# Altium footprint library Espressif.PcbLib: 4 footprints
Each footprint in its own frame and in the unit in brackets; x right, y up, seen from the top. Pads: shape width x height; smd on the part's side, far side on the other; paste and mask are expansions set on the pad; w line width, h text height; cw(c..) or ccw(c..) is an arc to the next point about the centre after c.
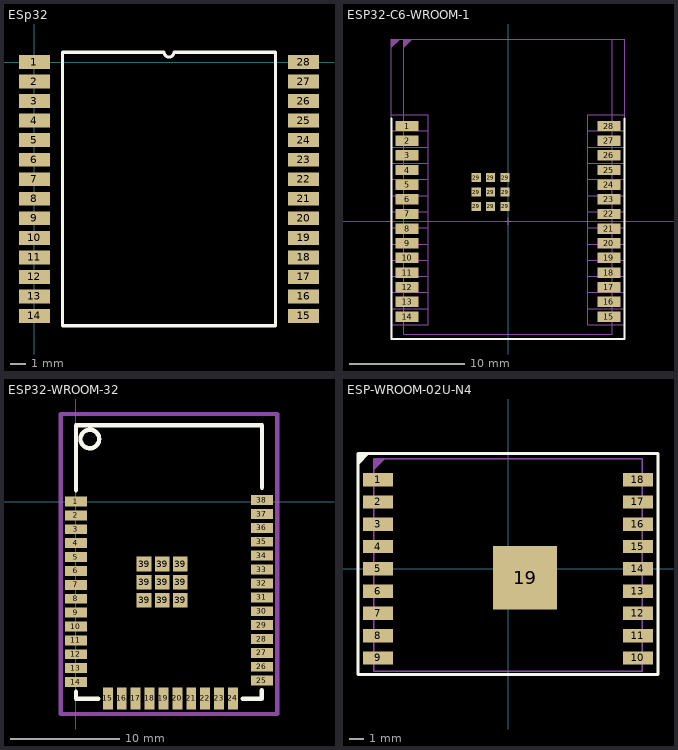
[diagram p0: the footprints below, top view; thin cyan lines are the x and y axes]

## ESp32 [mm]
pads (28):
  rect 2x0.9 smd: 1(0,0) 2(0,-1.27) 3(0,-2.54) 4(0,-3.81) 5(0,-5.08) 6(0,-6.35) 7(0,-7.62) 8(0,-8.89) 9(0,-10.16) 10(0,-11.43) 11(0,-12.7) 12(0,-13.97) 13(0,-15.24) 14(0,-16.51) 15(17.5,-16.51) 16(17.5,-15.24) 17(17.5,-13.97) 18(17.5,-12.7) 19(17.5,-11.43) 20(17.5,-10.16) 21(17.5,-8.89) 22(17.5,-7.62) 23(17.5,-6.35) 24(17.5,-5.08) 25(17.5,-3.81) 26(17.5,-2.54) 27(17.5,-1.27) 28(17.5,0)
Top Overlay:
  lines w0.2: 1.835,-17.145 1.835,0.635 8.433,0.635 ccw(c8.75,0.635) 9.068,0.635 15.665,0.635 15.665,-17.145 1.835,-17.145

## ESP32-C6-WROOM-1 [mm]
pads (37):
  rect 2x0.9 smd: 1(-8.75,8.255) 2(-8.75,6.985) 3(-8.75,5.715) 4(-8.75,4.445) 5(-8.75,3.175) 6(-8.75,1.905) 7(-8.75,0.635) 8(-8.75,-0.635) 9(-8.75,-1.905) 10(-8.75,-3.175) 11(-8.75,-4.445) 12(-8.75,-5.715) 13(-8.75,-6.985) 14(-8.75,-8.255) 15(8.75,-8.255) 16(8.75,-6.985) 17(8.75,-5.715) 18(8.75,-4.445) 19(8.75,-3.175) 20(8.75,-1.905) 21(8.75,-0.635) 22(8.75,0.635) 23(8.75,1.905) 24(8.75,3.175) 25(8.75,4.445) 26(8.75,5.715) 27(8.75,6.985) 28(8.75,8.255)
  rect 0.8x0.8 smd: 29(-2.755,1.285) 29(-2.755,2.535) 29(-2.755,3.785) 29(-1.505,1.285) 29(-1.505,2.535) 29(-1.505,3.785) 29(-0.255,1.285) 29(-0.255,2.535) 29(-0.255,3.785)
Top Overlay:
  lines w0.2: -10.1,8.9 -10.1,-10.2 10.1,-10.2 10.1,8.9
Top Assembly:
  region: -9.025,15.8 -9.025,15.1 -8.325,15.8
  lines w0.1: -9.025,15.1 -8.325,15.8 ; -9.025,-9.8 -9.025,15.8 9.05,15.8 9.05,-9.8 -9.025,-9.8
  text "'.Designator'" at -4.532,-0.333 h0.8
Top Courtyard:
  region: -10.1,15.8 -10.1,15.1 -9.4,15.8
  lines w0.1: -10.1,15.1 -9.4,15.8 ; -0.3,0 0.3,0 ; 0,-0.3 0,0.3 ; -10.1,-10.2 -10.1,15.8 10.1,15.8 10.1,-10.2 -10.1,-10.2
  text "'.Designator'" at -4.532,-0.333 h0.8
Bottom Courtyard:
  lines w0.1: -10.1,-7.57 -10.1,-8.97 -6.9,-8.97 -6.9,-7.57 ; -10.1,-7.57 -10.1,-6.17 ; -10.1,-7.57 -6.9,-7.57 ; -10.1,-6.17 -10.1,-4.77 ; -10.1,-6.17 -6.9,-6.17 ; -10.1,-4.77 -10.1,-3.37 ; -10.1,-4.77 -6.9,-4.77 ; -10.1,-3.37 -6.9,-3.37 ; -10.1,-3.37 -10.1,-1.97 ; -10.1,-1.97 -10.1,-0.57 ; -10.1,-1.97 -6.9,-1.97 ; -10.1,-0.57 -10.1,0.83 ; -10.1,-0.57 -6.9,-0.57 ; -10.1,0.83 -10.1,2.23 ; -10.1,0.83 -6.9,0.83 ; -10.1,2.23 -10.1,3.63 ; -10.1,2.23 -6.9,2.23 ; -10.1,3.63 -10.1,5.03 ; -10.1,3.63 -6.9,3.63 ; -10.1,5.03 -10.1,6.43 ; -10.1,5.03 -6.9,5.03 ; -10.1,6.43 -10.1,7.83 ; -10.1,6.43 -6.9,6.43 ; -10.1,7.83 -10.1,9.23 -6.9,9.23 -6.9,7.83 ; -10.1,7.83 -6.9,7.83 ; -6.9,-7.57 -6.9,-6.17 ; -6.9,-6.17 -6.9,-4.77 ; -6.9,-4.77 -6.9,-3.37 ; -6.9,-3.37 -6.9,-1.97 ; -6.9,-1.97 -6.9,-0.57 ; -6.9,-0.57 -6.9,0.83 ; -6.9,0.83 -6.9,2.23 ; -6.9,2.23 -6.9,3.63 ; -6.9,3.63 -6.9,5.03 ; -6.9,5.03 -6.9,6.43 ; -6.9,6.43 -6.9,7.83 ; 6.9,-7.57 10.1,-7.57 ; 6.9,-7.57 6.9,-6.17 ; 6.9,-7.57 6.9,-8.97 10.1,-8.97 10.1,-7.57 ; 6.9,-6.17 6.9,-4.77 ; 6.9,-6.17 10.1,-6.17 ; 6.9,-4.77 6.9,-3.37 ; 6.9,-4.77 10.1,-4.77 ; 6.9,-3.37 6.9,-1.97 ; 6.9,-3.37 10.1,-3.37 ; 6.9,-1.97 6.9,-0.57 ; 6.9,-1.97 10.1,-1.97 ; 6.9,-0.57 6.9,0.83 ; 6.9,-0.57 10.1,-0.57 ; 6.9,0.83 6.9,2.23 ; 6.9,0.83 10.1,0.83 ; 6.9,2.23 6.9,3.63 ; 6.9,2.23 10.1,2.23 ; 6.9,3.63 6.9,5.03 ; 6.9,3.63 10.1,3.63 ; 6.9,5.03 6.9,6.43 ; 6.9,5.03 10.1,5.03 ; 6.9,6.43 6.9,7.83 ; 6.9,6.43 10.1,6.43 ; 6.9,7.83 6.9,9.23 10.1,9.23 10.1,7.83 ; 6.9,7.83 10.1,7.83 ; 10.1,-7.57 10.1,-6.17 ; 10.1,-6.17 10.1,-4.77 ; 10.1,-4.77 10.1,-3.37 ; 10.1,-3.37 10.1,-1.97 ; 10.1,-1.97 10.1,-0.57 ; 10.1,-0.57 10.1,0.83 ; 10.1,0.83 10.1,2.23 ; 10.1,2.23 10.1,3.63 ; 10.1,3.63 10.1,5.03 ; 10.1,5.03 10.1,6.43 ; 10.1,6.43 10.1,7.83
3D body "ESP32-C6-WROOM-1.STEP": height 3.16, standoff 0, extent -8.922,-9.766 9.078,15.734

## ESP32-WROOM-32 [mm]
pads (47):
  rect 2x0.9 smd: 1(0,0) 2(0,-1.27) 3(0,-2.54) 4(0,-3.81) 5(0,-5.08) 6(0,-6.35) 7(0,-7.62) 8(0,-8.89) 9(0,-10.16) 10(0,-11.43) 11(0,-12.7) 12(0,-13.97) 13(0,-15.24) 14(0,-16.51) 25(17,-16.383) 26(17,-15.113) 27(17,-13.843) 28(17,-12.573) 29(17,-11.303) 30(17,-10.033) 31(17,-8.763) 32(17,-7.493) 33(17,-6.223) 34(17,-4.953) 35(17,-3.683) 36(17,-2.413) 37(17,-1.143) 38(17,0.127)
  rect 0.9x2 smd: 15(2.921,-18) 16(4.191,-18) 17(5.461,-18) 18(6.731,-18) 19(8.001,-18) 20(9.271,-18) 21(10.541,-18) 22(11.811,-18) 23(13.081,-18) 24(14.351,-18)
  rect 1.33x1.33 smd: 39(6.223,-9.017) 39(6.223,-7.366) 39(6.223,-5.715) 39(7.874,-9.017) 39(7.874,-7.366) 39(7.874,-5.715) 39(9.525,-9.017) 39(9.525,-7.366) 39(9.525,-5.715)
Top Overlay:
  circle w0.4: c1.27,5.715 r0.852
  lines w0.4: 0,-17.399 0,-18.034 2.032,-18.034 ; 0,1.016 0,6.985 17.018,6.985 17.018,1.27 ; 15.24,-18.034 16.976,-18.034 16.976,-17.272
Top Assembly:
  lines w0.4: -1.397,-19.431 18.415,-19.431 18.415,8.001 -1.397,8.001 -1.397,-19.431
3D body "ESP32-WROOM.STEP": height 2.91, standoff -0.01, extent -0.364,-17.907 17.636,7.593

## ESP-WROOM-02U-N4 [mm]
pads (19):
  rect 2x0.9 smd: 1(-8.75,6) 2(-8.75,4.5) 3(-8.75,3) 4(-8.75,1.5) 5(-8.75,0) 6(-8.75,-1.5) 7(-8.75,-3) 8(-8.75,-4.5) 9(-8.75,-6) 10(8.75,-6) 11(8.75,-4.5) 12(8.75,-3) 13(8.75,-1.5) 14(8.75,0) 15(8.75,1.5) 16(8.75,3) 17(8.75,4.5) 18(8.75,6)
  rect 4.3x4.3 smd: 19(1.15,-0.6)
Top Overlay:
  region: -10.1,7.75 -10.1,7.05 -9.4,7.75
  lines w0.1: -10.1,7.05 -9.4,7.75
  lines w0.2: -10.1,-7.1 -10.1,7.75 10.1,7.75 10.1,-7.1 -10.1,-7.1
Top Assembly:
  region: -9.025,7.4 -9.025,6.7 -8.325,7.4
  lines w0.1: -9.025,6.7 -8.325,7.4 ; -9.025,-6.9 -9.025,7.4 9.05,7.4 9.05,-6.9 -9.025,-6.9
  text "'.Designator'" at -4.532,-0.333 h0.8
Bottom 3D Body:
  region: -9.025,7.4 -9.025,6.7 -8.325,7.4
  lines w0.1: -9.025,6.7 -8.325,7.4 ; -0.3,0 0.3,0 ; 0,-0.3 0,0.3 ; -9.025,-6.9 9.05,-6.9 9.05,7.4 -9.025,7.4 -9.025,-6.9
  text "'.Designator'" at -4.532,-0.333 h0.8
3D body "ESP-WROOM-02U.step": height 3.28, standoff 0.05, extent -9.035,-6.9 9.035,7.4